# Altium footprint library AMLB_v1.PcbLib: 167 footprints (part 7 of 11)
Each footprint in its own frame and in the unit in brackets; x right, y up, seen from the top. Pads: shape width x height; smd on the part's side, far side on the other; paste and mask are expansions set on the pad; w line width, h text height; cw(c..) or ccw(c..) is an arc to the next point about the centre after c.
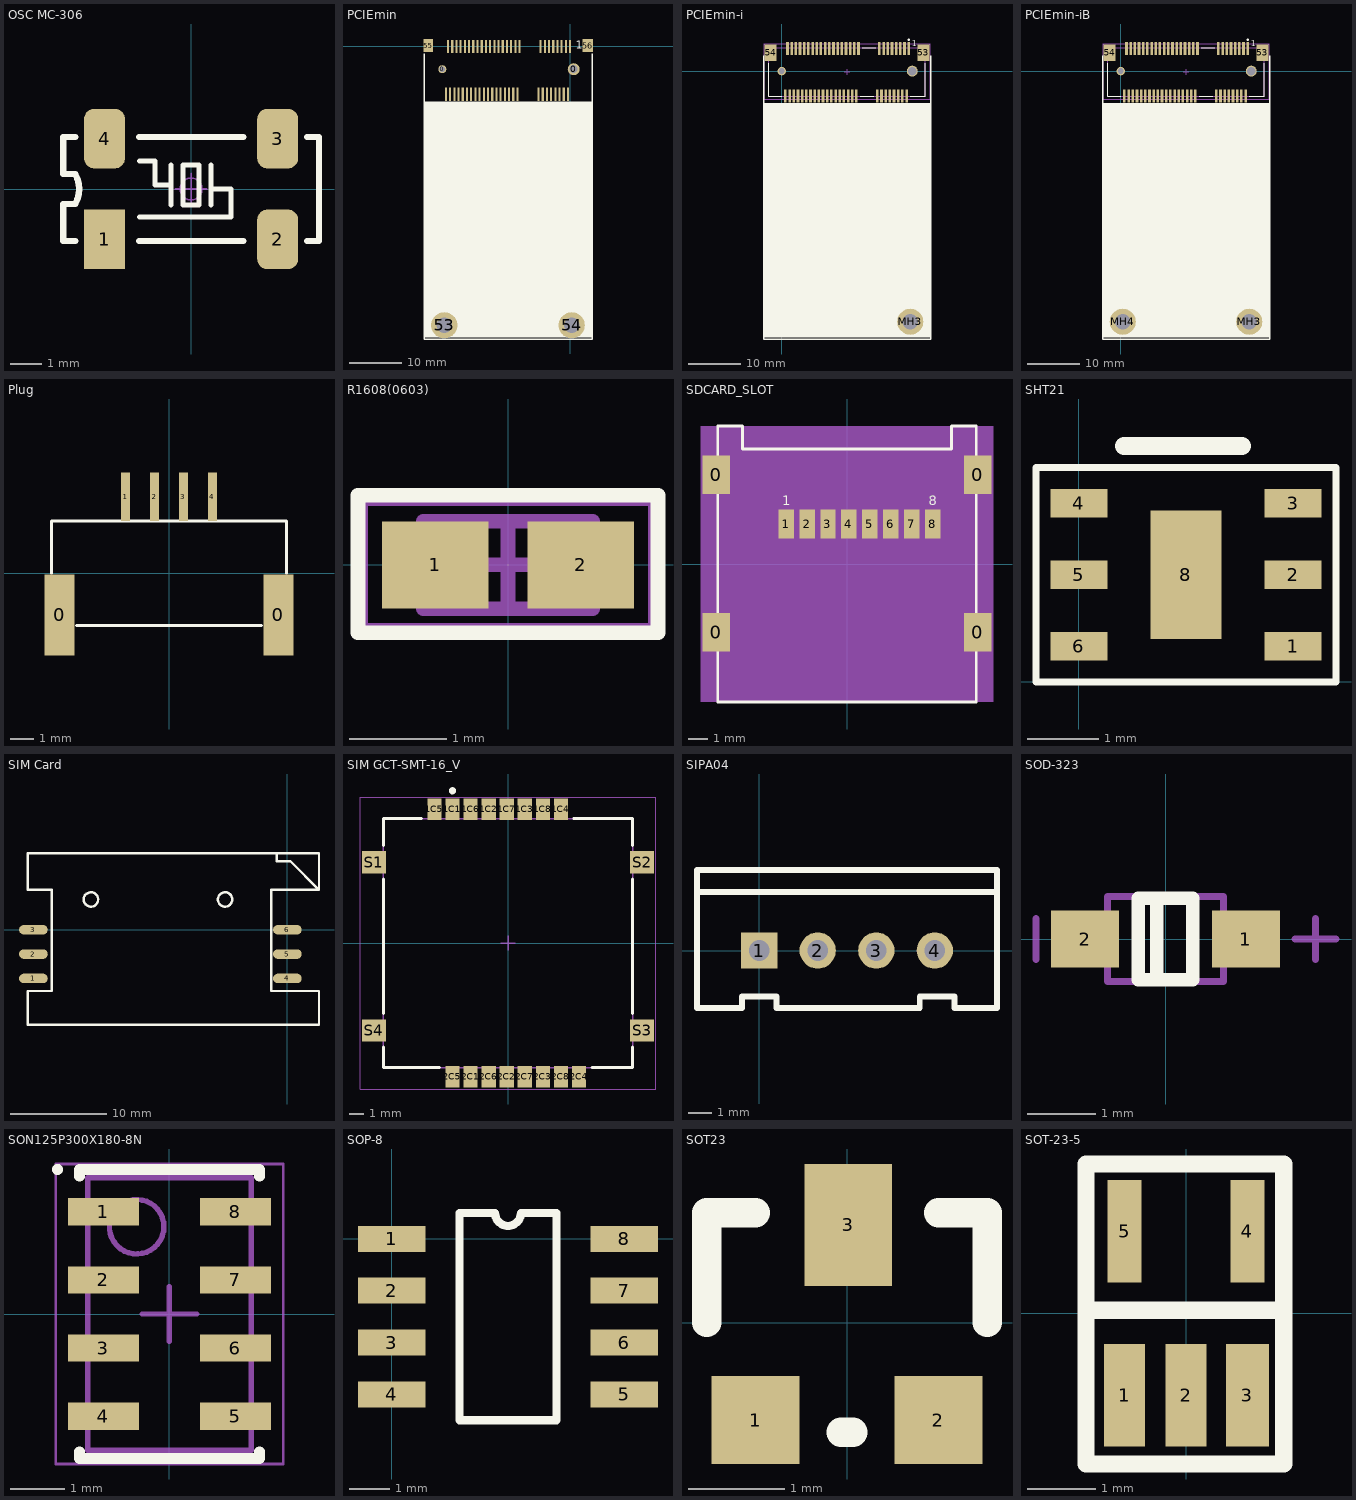
[diagram p6: the footprints below, top view; thin cyan lines are the x and y axes]

## OSC MC-306 [mm] "8mm*3.2mm*2.54mm(长*宽*高)"
pads (4):
  rect 1.3x1.9 smd: 1(-2.75,-1.6)
  rrect50% 1.3x1.9 smd: 2(2.75,-1.6) 3(2.75,1.6) 4(-2.75,1.6)
Top Overlay:
  lines w0.152: -1.651,-0.889 1.27,-0.889 1.27,0 0.635,0 ; -1.651,0.889 -1.143,0.889 -1.143,0.127 -0.889,0.127 -0.635,0.127 ; -0.635,-0.508 -0.635,0.762 ; 0.635,-0.508 0.635,0.762 ; -0.254,-0.508 0.254,-0.508 0.254,0.762 -0.254,0.762 -0.254,-0.508
  lines w0.203: -3.683,-1.651 -4.064,-1.651 -4.064,-0.476 -3.683,-0.476 ccw(c-4.512,0) -3.683,0.476 -4.064,0.476 -4.064,1.651 -3.683,1.651 ; -1.651,-1.651 1.651,-1.651 ; -1.651,1.651 1.651,1.651 ; 3.683,-1.651 4.064,-1.651 4.064,1.651 3.683,1.651
Mechanical 15:
  circle w0.05: c0,0 r0.35
  lines w0.05: -0.5,0 0.5,0 ; 0,-0.5 0,0.5
3D body "OSC MC-306-4.STEP": height 2.56, standoff 0, extent -4,-1.63 4,1.63

## PCIEmin [mm]
pads (58):
  round 1.524 hole 0.991: 0(-24.3,-4.35)
  round 2.286 hole 1.524: 0(0.7,-4.35)
  rect 0.4x2.5 smd: 1(0,0) 2(-0.4,-9.1) 3(-0.8,0) 4(-1.2,-9.1) 5(-1.6,0) 6(-2,-9.1) 7(-2.4,0) 8(-2.8,-9.1) 9(-3.2,0) 10(-3.6,-9.1) 11(-4,0) 12(-4.4,-9.1) 13(-4.8,0) 14(-5.2,-9.1) 15(-5.6,0) 16(-6,-9.1) 17(-9.6,0) 18(-10,-9.1) 19(-10.4,0) 20(-10.8,-9.1) 21(-11.2,0) 22(-11.6,-9.1) 23(-12,0) 24(-12.4,-9.1) 25(-12.8,0) 26(-13.2,-9.1) 27(-13.6,0) 28(-14,-9.1) 29(-14.4,0) 30(-14.8,-9.1) 31(-15.2,0) 32(-15.6,-9.1) 33(-16,0) 34(-16.4,-9.1) 35(-16.8,0) 36(-17.2,-9.1) 37(-17.6,0) 38(-18,-9.1) 39(-18.4,0) 40(-18.8,-9.1) 41(-19.2,0) 42(-19.6,-9.1) 43(-20,0) 44(-20.4,-9.1) 45(-20.8,0) 46(-21.2,-9.1) 47(-21.6,0) 48(-22,-9.1) 49(-22.4,0) 50(-22.8,-9.1) 51(-23.2,0) 52(-23.6,-9.1)
  round 5 hole 3: 53(-23.92,-53.05) 54(0.316,-53.05)
  rect 1.8x2.5 smd: 55(-26.95,0.15)
  rect 2x2.5 smd: 56(3.35,0.15)
Top Overlay:
  rectangle: -27.698,-55.359 4.052,-10.502
  lines w0.254: -27.772,-34.088 -27.772,-1.44 ; -27.772,-33.952 -27.772,-49.702 -27.772,-55.634 -27.748,-55.658 4.208,-55.658 4.232,-55.634 4.232,-49.7 ; 4.232,-49.702 4.232,-33.952 4.236,-33.952 ; 4.232,-1.44 4.236,-33.95
  text "1" at 1.1,-0.419 h1.52

## PCIEmin-i [mm]
pads (57):
  rect 0.5x2.5 smd: 1(24.3,4.35) 2(23.9,-4.75) 3(23.5,4.35) 4(23.1,-4.75) 5(22.7,4.35) 6(22.3,-4.75) 7(21.9,4.35) 8(21.5,-4.75) 9(21.1,4.35) 10(20.7,-4.75) 11(20.3,4.35) 12(19.9,-4.75) 13(19.5,4.35) 14(19.1,-4.75) 15(18.7,4.35) 16(18.3,-4.75) 17(14.7,4.35) 18(14.3,-4.75) 19(13.9,4.35) 20(13.5,-4.75) 21(13.1,4.35) 22(12.7,-4.75) 23(12.3,4.35) 24(11.9,-4.75) 25(11.5,4.35) 26(11.1,-4.75) 27(10.7,4.35) 28(10.3,-4.75) 29(9.9,4.35) 30(9.5,-4.75) 31(9.1,4.35) 32(8.7,-4.75) 33(8.3,4.35) 34(7.9,-4.75) 35(7.5,4.35) 36(7.1,-4.75) 37(6.7,4.35) 38(6.3,-4.75) 39(5.9,4.35) 40(5.5,-4.75) 41(5.1,4.35) 42(4.7,-4.75) 43(4.3,4.35) 44(3.9,-4.75) 45(3.5,4.35) 46(3.1,-4.75) 47(2.7,4.35) 48(2.3,-4.75) 49(1.9,4.35) 50(1.5,-4.75) 51(1.1,4.35) 52(0.7,-4.75)
  rect 2.3x3.2 smd: 53(27.133,3.512) 54(-2.15,3.5)
  round 2.1 hole 1.6: MH1(25,0)
  round 1.6 hole 1.1: MH2(0,0)
  round 5 hole 3: MH3(24.616,-48)
Top Overlay:
  circle w0.25: c24.3,6.026 r0.125
  rectangle: -3.398,-51.009 28.352,-6.152
  lines w0.2: -2.5,1.5 -2.5,-4.8 0,-4.8 ; 15,-4.8 17.6,-4.8 ; 15.4,4.5 18,4.5 ; 24.6,-4.8 27.5,-4.8 27.5,1.5
  lines w0.254: -3.472,-29.738 -3.472,2.91 ; -3.472,-29.602 -3.472,-45.352 -3.472,-51.284 -3.448,-51.308 28.508,-51.308 28.532,-51.284 28.532,-45.35 ; 28.532,-45.352 28.532,-29.602 28.536,-29.602 ; 28.532,2.91 28.536,-29.6
  text "1" at 24.884,4.731 h1.2
Mechanical 13:
  lines w0.1: -2.5,-4.8 27.5,-4.8 27.5,4.5 -2.5,4.5 -2.5,-4.8
Mechanical 15:
  lines w0.05: -3.4,-5.35 28.4,-5.35 28.4,5.2 -3.4,5.2 -3.4,-5.35
  lines w0.1: 12,-0.15 13,-0.15 ; 12.5,-0.65 12.5,0.35
3D body "483380099.stp": height 9.9, standoff -0.65, extent -2.486,-4.8 27.514,4.5

## PCIEmin-iB [mm] "Backup"
pads (58):
  rect 0.5x2.5 smd: 1(24.3,4.35) 2(23.9,-4.75) 3(23.5,4.35) 4(23.1,-4.75) 5(22.7,4.35) 6(22.3,-4.75) 7(21.9,4.35) 8(21.5,-4.75) 9(21.1,4.35) 10(20.7,-4.75) 11(20.3,4.35) 12(19.9,-4.75) 13(19.5,4.35) 14(19.1,-4.75) 15(18.7,4.35) 16(18.3,-4.75) 17(14.7,4.35) 18(14.3,-4.75) 19(13.9,4.35) 20(13.5,-4.75) 21(13.1,4.35) 22(12.7,-4.75) 23(12.3,4.35) 24(11.9,-4.75) 25(11.5,4.35) 26(11.1,-4.75) 27(10.7,4.35) 28(10.3,-4.75) 29(9.9,4.35) 30(9.5,-4.75) 31(9.1,4.35) 32(8.7,-4.75) 33(8.3,4.35) 34(7.9,-4.75) 35(7.5,4.35) 36(7.1,-4.75) 37(6.7,4.35) 38(6.3,-4.75) 39(5.9,4.35) 40(5.5,-4.75) 41(5.1,4.35) 42(4.7,-4.75) 43(4.3,4.35) 44(3.9,-4.75) 45(3.5,4.35) 46(3.1,-4.75) 47(2.7,4.35) 48(2.3,-4.75) 49(1.9,4.35) 50(1.5,-4.75) 51(1.1,4.35) 52(0.7,-4.75)
  rect 2.3x3.2 smd: 53(27.133,3.512) 54(-2.15,3.5)
  round 2.1 hole 1.6: MH1(25,0)
  round 1.6 hole 1.1: MH2(0,0)
  round 5 hole 3: MH3(24.616,-48) MH4(0.38,-48)
Top Overlay:
  circle w0.25: c24.3,6.026 r0.125
  rectangle: -3.398,-51.009 28.352,-6.152
  lines w0.2: -2.5,1.5 -2.5,-4.8 0,-4.8 ; 15,-4.8 17.6,-4.8 ; 15.4,4.5 18,4.5 ; 24.6,-4.8 27.5,-4.8 27.5,1.5
  lines w0.254: -3.472,-29.738 -3.472,2.91 ; -3.472,-29.602 -3.472,-45.352 -3.472,-51.284 -3.448,-51.308 28.508,-51.308 28.532,-51.284 28.532,-45.35 ; 28.532,-45.352 28.532,-29.602 28.536,-29.602 ; 28.532,2.91 28.536,-29.6
  text "1" at 24.884,4.731 h1.2
Mechanical 13:
  lines w0.1: -2.5,-4.8 -2.5,4.5 27.5,4.5 27.5,-4.8 -2.5,-4.8
Mechanical 15:
  lines w0.05: -3.4,-5.35 -3.4,5.2 28.4,5.2 28.4,-5.35 -3.4,-5.35
  lines w0.1: 12,-0.15 13,-0.15 ; 12.5,-0.65 12.5,0.35
3D body "483380099.stp": height 9.9, standoff -0.65, extent -2.486,-4.8 27.514,4.5

## Plug [mm]
pads (6):
  rect 1.3x3.5 smd: 0(-4.725,-1.8) 0(4.725,-1.8)
  rect 0.4x2.1 smd: 1(-1.875,3.3) 2(-0.625,3.3) 3(0.625,3.3) 4(1.875,3.3)
Top Overlay:
  lines w0.127: -5.08,0 -5.08,2.25 5.075,2.25 5.075,0 ; -4,-2.25 4,-2.25

## R1608(0603) [mm] "Chip Resistance, 2-Leads, Body 1.60x0.80mm, IPC Medium Density"
height 0.4
pads (2):
  rect 1.1x0.9 smd: 1(-0.75,0) 2(0.75,0)
Top Overlay:
  lines w0.15: -1.55,0.7 -1.55,-0.7 1.55,-0.7 1.55,0.7 ; -1.55,0.72 1.55,0.72
Mechanical 13:
  lines w0.15: -0.875,-0.45 0.875,-0.45 0.875,0.45 -0.875,0.45 -0.875,-0.45
Mechanical 15:
  lines w0.05: -1.473,-0.622 1.473,-0.622 1.473,0.635 -1.473,0.635 -1.473,-0.622
  lines w0.15: -0.45,0 0.45,0 ; 0,-0.45 0,0.45
3D body: height 0.4, standoff 0, extent 0.575,-0.45 0.875,0.45
3D body: height 0.4, standoff 0, extent -0.875,-0.45 -0.575,0.45
3D body: height 0.4, standoff 0, extent -0.575,-0.45 0.575,0.45

## SDCARD_SLOT [mil] "500901-0801"
pads (12):
  rect 57x80 smd: 0(-270.67,-141.73) 0(-270.67,185.05) 0(270.67,-141.73) 0(270.67,185.05)
  rect 32x60 smd: 1(-125.98,82.68) 2(-82.68,82.68) 3(-39.37,82.68) 4(3.94,82.68) 5(47.24,82.68) 6(90.55,82.68) 7(133.86,82.68) 8(177.17,82.68)
Top Overlay:
  lines w6: -267.72,-194.88 -267.72,-285.43 ; -267.72,-88.58 -267.72,131.9 ; -267.72,238.2 -267.72,285.44 ; 267.72,-194.88 267.72,-285.43 ; 267.72,-88.58 267.72,131.9 ; 267.72,238.2 267.72,285.44 ; -267.72,-285.43 -267.72,285.44 ; -267.72,-285.43 267.72,-285.43 ; -267.72,-285.43 267.72,-285.43 ; -267.72,285.44 -216.54,285.44 ; -267.72,285.44 -216.54,285.44 ; -216.54,238.2 -216.54,285.44 ; -216.54,238.2 216.54,238.2 ; -216.54,238.2 -216.54,285.44 ; -216.54,238.2 216.54,238.2 ; 216.54,238.2 216.54,285.44 ; 216.54,238.2 216.54,285.44 ; 216.54,285.44 267.72,285.44 ; 216.54,285.44 267.72,285.44 ; 267.72,-285.43 267.72,285.44
  text "1" at -133.86,121.4 h20
  text "8" at 169.29,121.4 h20
Mechanical 8:
  text "3" at -47.37,82.68 h20
  text "5" at 39.24,82.68 h20
  text "7" at 125.86,82.68 h20
  text "8" at 169.17,82.68 h20
  text "1" at -133.98,82.68 h20
  text "2" at -90.68,82.68 h20
  text "4" at -4.06,82.68 h20
  text "6" at 82.55,82.68 h20
  text "11" at -286.67,-141.73 h20
  text "9" at -278.67,185.05 h20
  text "12" at 254.67,-141.73 h20
  text "10" at 254.67,185.05 h20
Mechanical 10:
  region: -303.15,285.44 -303.15,-285.43 303.15,-285.43 303.15,285.44

## SHT21 [mm]
pads (7):
  rect 0.8x0.4 smd: 1(3,0.5) 2(3,1.5) 3(3,2.5) 4(0,2.5) 5(0,1.5) 6(0,0.5)
  rect 1x1.8 smd: 8(1.5,1.5)
Top Overlay:
  lines w0.1: -0.6,0 3.6,0 3.6,3 -0.6,3 -0.6,0
  lines w0.254: 0.635,3.302 2.286,3.302

## SIM Card [mm] "MUP , 6P"
height 2
pads (6):
  oval 3x1 smd: 1(-26.5,-5.08) 2(-26.5,-2.54) 3(-26.5,0) 4(0,-5.08) 5(0,-2.54) 6(0,0)
Top Overlay:
  circle w0.254: c-20.5,3.16 r0.75
  circle w0.254: c-6.5,3.16 r0.75
  lines w0.254: -1.1,7.96 -1.1,7.16 0.3,7.16 3.3,4.16 ; 3.3,4.16 3.3,7.96 -2.451,7.96 -27.1,7.96 -27.1,4.16 -24.6,4.16 -24.6,-6.39 -27.1,-6.39 -27.1,-9.89 3.3,-9.89 3.3,-6.39 -1.7,-6.39 -1.7,4.16 3.3,4.16
3D body "User Library-SIM5060-6-0-26-01-A.STEP": height 2.6, standoff -0.7, extent -26.48,-9.85 3.16,7.35

## SIM GCT-SMT-16_V [mm] "SMT, 16-Leads, Body 17.5x17.5mm, Pitch 1.27mm"
height 3
pads (20):
  rect 1x1.5 smd: 1C1(-3.9,9.4) 1C2(-1.36,9.4) 1C3(1.18,9.4) 1C4(3.72,9.4) 1C5(-5.17,9.4) 1C6(-2.63,9.4) 1C7(-0.09,9.4) 1C8(2.45,9.4) 2C1(-2.63,-9.4) 2C2(-0.09,-9.4) 2C3(2.45,-9.4) 2C4(4.99,-9.4) 2C5(-3.9,-9.4) 2C6(-1.36,-9.4) 2C7(1.18,-9.4) 2C8(3.72,-9.4)
  rect 1.7x1.55 smd: S1(-9.42,5.68) S2(9.42,5.68) S3(9.42,-6.13) S4(-9.42,-6.13)
Top Overlay:
  circle w0.25: c-3.9,10.7 r0.125
  lines w0.2: -8.75,-7.305 -8.75,-8.75 -4.8,-8.75 ; -8.75,-4.955 -8.75,4.505 ; -8.75,6.855 -8.75,8.75 -6.07,8.75 ; 4.62,8.75 8.75,8.75 8.75,6.855 ; 5.89,-8.75 8.75,-8.75 8.75,-7.305 ; 8.75,-4.955 8.75,4.505
Mechanical 13:
  lines w0.1: -8.75,-8.75 8.75,-8.75 8.75,8.75 -8.75,8.75 -8.75,-8.75
Mechanical 15:
  lines w0.05: -10.37,-10.25 -10.37,10.25 10.37,10.25 10.37,-10.25 -10.37,-10.25
  lines w0.1: -0.5,0 0.5,0 ; 0,-0.5 0,0.5
3D body: height 3, standoff 0, extent -8.75,-8.75 8.75,8.75

## SIPA04 [mil]
pads (4):
  rect 62x62 hole 35.43: 1(0,0)
  round 62 hole 35.43: 2(100,0) 3(200,0) 4(300,0)
Top Overlay:
  lines w10: -102.48,100 -6.3,100 404.72,100 ; 404.72,137.79 -6.3,137.79 -106.3,137.79 -106.3,-98.42 -29.53,-98.42 -29.53,-78.74 29.53,-78.74 29.53,-98.42 174.41,-98.42 274.41,-98.42 274.41,-78.74 333.46,-78.74 333.46,-98.42 406.3,-98.42 406.3,137.79
3D body "User Library-B4B-XH-A.STEP": height 279.53, standoff -129.92, extent -94.09,-92.36 394.1,134.02

## SOD-323 [mm]
pads (2):
  rect 1x0.83 smd: 1(1.18,0) 2(-1.18,0)
Top Overlay:
  lines w0.2: -0.13,-0.6 -0.13,0.6 ; -0.4,-0.6 0.4,-0.6 0.4,0.6 -0.4,0.6 -0.4,-0.6
Mechanical 13:
  lines w0.1: -0.85,-0.625 0.85,-0.625 0.85,0.625 -0.85,0.625 -0.85,-0.625
Mechanical 15:
  lines w0.1: -1.9,-0.3 -1.9,0.3 ; 1.9,0 2.5,0 ; 2.2,-0.3 2.2,0.3
3D body "SOD323.STEP": height 1.1, standoff 0, extent -1.35,-0.625 1.35,0.625

## SON125P300X180-8N [mm] "SON, 8-Leads, Body 5.00x3.00mm, Pitch 1.25mm, IPC Medium Density"
height 1.8
pads (8):
  rect 1.3x0.5 smd: 1(-1.21,1.875) 2(-1.21,0.625) 3(-1.21,-0.625) 4(-1.21,-1.875) 5(1.21,-1.875) 6(1.21,-0.625) 7(1.21,0.625) 8(1.21,1.875)
Top Overlay:
  circle w0.1: c-2.05,2.65 r0.05
  lines w0.2: -1.65,-2.525 -1.65,-2.65 1.65,-2.65 1.65,-2.525 ; -1.65,2.525 -1.65,2.65 1.65,2.65 1.65,2.525
Mechanical 13:
  circle w0.1: c-0.6,1.6 r0.5
  lines w0.1: -1.5,-2.5 1.5,-2.5 1.5,2.5 -1.5,2.5 -1.5,-2.5
Mechanical 15:
  lines w0.05: -2.085,-2.75 2.085,-2.75 2.085,2.75 -2.085,2.75 -2.085,-2.75
  lines w0.1: -0.5,0 0.5,0 ; 0,-0.5 0,0.5
3D body: height 1.8, standoff 0.5, extent -1.5,-2.5 1.5,2.5

## SOP-8 [mil]
pads (8):
  rect 65x25 smd: 1(0,0) 2(0,-50) 3(0,-100) 4(0,-150) 5(224.41,-150) 6(224.41,-100) 7(224.41,-50) 8(224.41,0)
Top Overlay:
  lines w7.87: 65.37,-175 65.37,25 99.7,25 ccw(c112.2,25) 124.7,25 159.03,25 159.03,-175 65.37,-175

## SOT23 [mil]
pads (3):
  rect 36x36 smd: 1(-37.5,-40) 2(37.5,-40)
  rect 36x50 smd: 3(0.5,40)
Top Overlay:
  lines w12: -57.5,0 -57.5,45 -37.5,45 ; -2.5,-45 2.5,-45 ; 37.5,45 57.5,45 57.5,0

## SOT-23-5 [mm]
height 4.32
pads (5):
  rect 0.6x1.5 smd: 1(-0.9,-1.2) 2(0,-1.2)
  rect 0.63x1.5 smd: 3(0.9,-1.2)
  rect 0.5x1.5 smd: 4(0.9,1.2) 5(-0.9,1.2)
Top Overlay:
  lines w0.254: -1.466,0.041 1.43,0.041 ; -1.466,-2.21 1.43,-2.21 1.43,2.184 -1.466,2.184 -1.466,-2.21